# Altium footprint library THU.PcbLib: 477 footprints (part 16 of 30)
Each footprint in its own frame and in the unit in brackets; x right, y up, seen from the top. Pads: shape width x height; smd on the part's side, far side on the other; paste and mask are expansions set on the pad; w line width, h text height; cw(c..) or ccw(c..) is an arc to the next point about the centre after c.
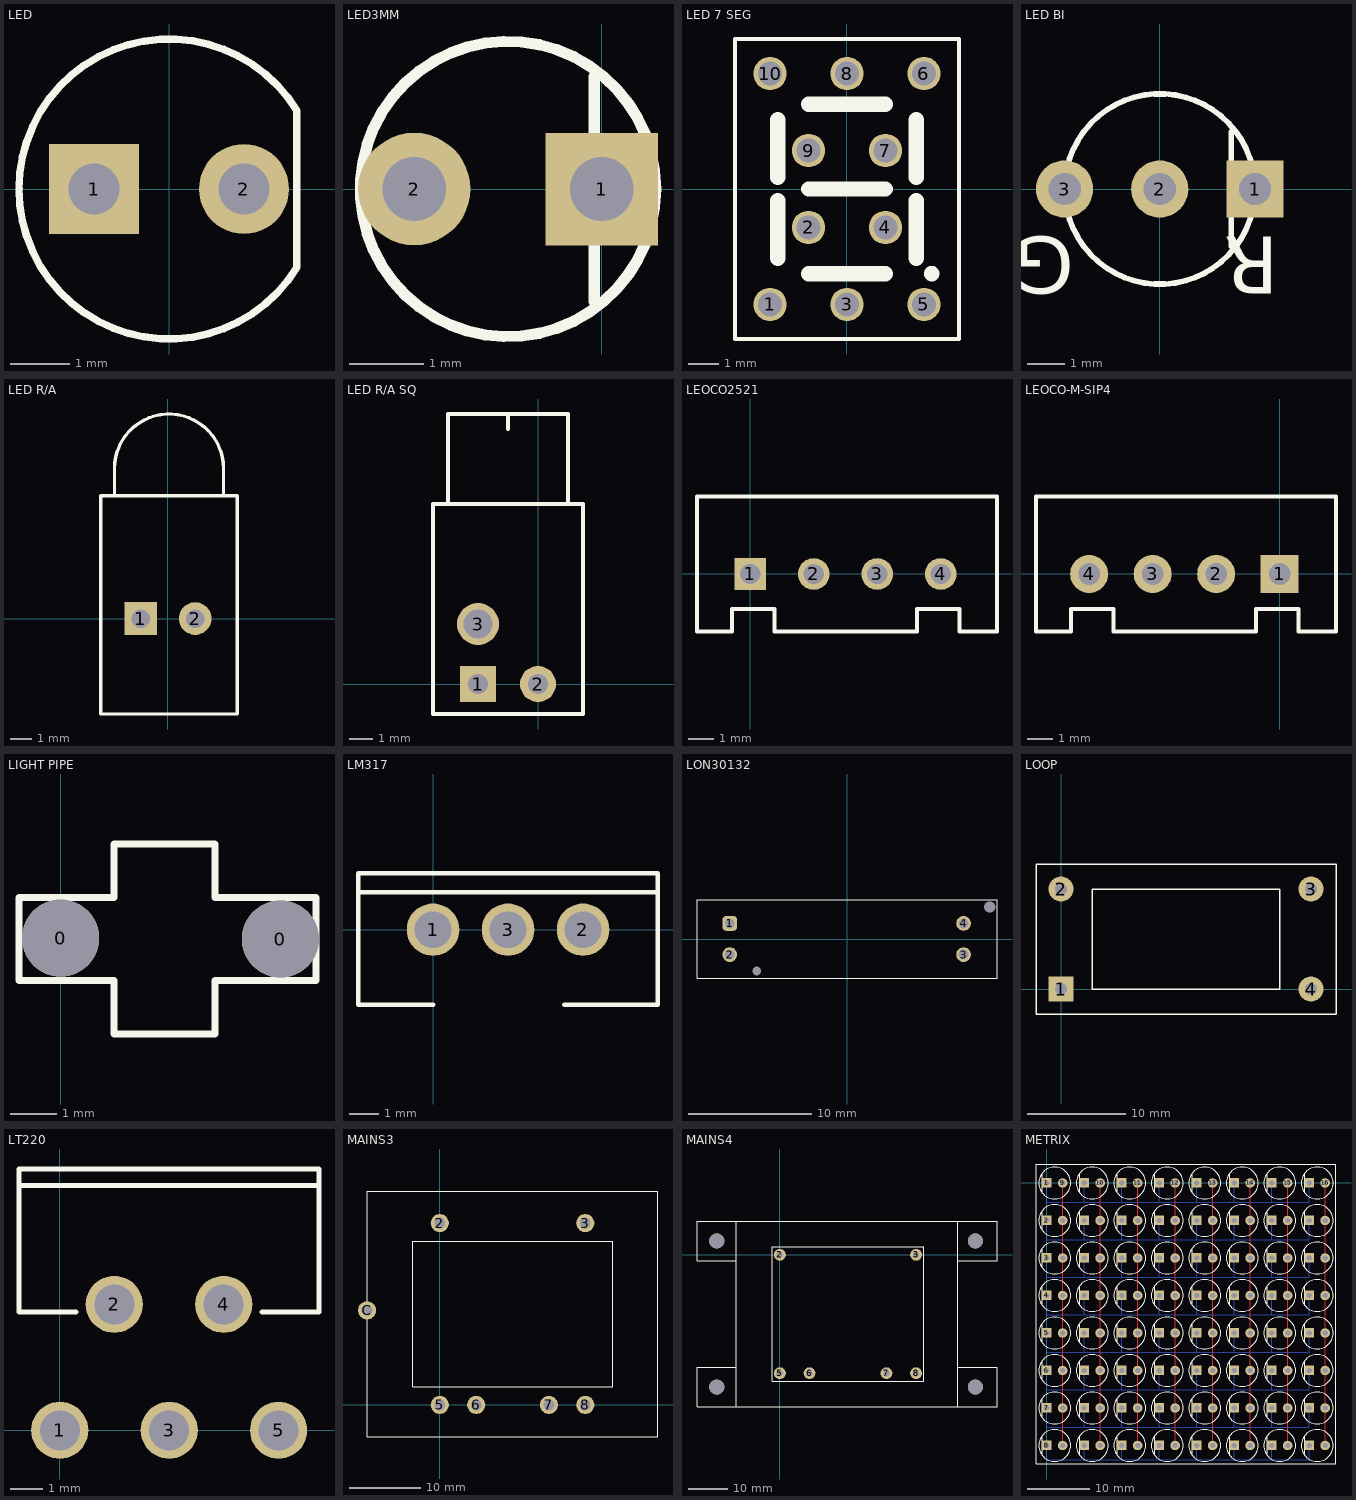
[diagram p15: the footprints below, top view; thin cyan lines are the x and y axes]

## LED [mil]
pads (2):
  rect 60x60 hole 34: 1(-50,0)
  round 60 hole 34: 2(50,0)
TopOverlay:
  lines w5: 85.3,-52.19 cw(c0,0) 85.3,52.19 85.3,-52.19

## LED3MM [mil]
pads (2):
  rect 60x60 hole 34: 1(0,0)
  round 60 hole 34: 2(-100,0)
TopOverlay:
  circle w6: c-50,0 r78.74
  lines w6: -4,-60 -4,60

## LED 7 SEG [mm] "VISHAY SEMICONDUCTOR  TDSL1150"
height 6
pads (10):
  round 1.1 hole 0.8 unplated: 1(-2.54,-3.81) 2(-1.27,-1.27) 3(0,-3.81) 4(1.27,-1.27) 5(2.54,-3.81) 6(2.54,3.81) 7(1.27,1.27) 8(0,3.81) 9(-1.27,1.27) 10(-2.54,3.81)
TopOverlay:
  circle w0.254: c2.794,-2.794 r0.127
  lines w0.127: -3.7,-4.95 3.7,-4.95 3.7,4.95 -3.7,4.95 -3.7,-4.95
  lines w0.508: -2.286,-2.286 -2.286,-0.381 ; -2.286,0.381 -2.286,2.286 ; -1.27,-2.794 1.27,-2.794 ; -1.27,0 1.27,0 ; -1.27,2.794 1.27,2.794 ; 2.286,-2.286 2.286,-0.381 ; 2.286,0.381 2.286,2.286

## LED BI [mil]
pads (3):
  rect 60x60 hole 34: 1(100,0)
  round 60 hole 34: 2(0,0) 3(-100,0)
TopOverlay:
  circle w6: c0,0 r100
  lines w6: 75,-60 75,60
  text "G" at -90,-50 h60
  text "R" at 125,-50 h60

## LED R/A [mil]
pads (2):
  rect 60x60 hole 34: 1(-50,0)
  round 60 hole 34: 2(50,0)
TopOverlay:
  lines w6: -98,225 -98,275 cw(c2,275) 102,275 102,225 ; -123,-175 -123,225 127,225 127,-175 -123,-175

## LED R/A SQ [mil]
pads (3):
  rect 60x60 hole 34: 1(-100,0)
  round 60 hole 34: 2(0,0)
  round 70 hole 49: 3(-100,100)
TopOverlay:
  lines w6: -150,300 -150,450 50,450 50,300 ; -50,425 -50,450 ; -175,-50 -175,300 75,300 75,-50 -175,-50

## LEOCO2521 [mil]
pads (4):
  rect 50x50 hole 32: 1(0,0)
  round 50 hole 32: 2(100,0) 3(200,0) 4(300,0)
TopOverlay:
  lines w6: 388.74,118.11 388.74,-90.55 329.69,-90.55 329.69,-55.12 262.76,-55.12 262.76,-90.55 38.35,-90.55 38.35,-55.12 -28.58,-55.12 -28.58,-90.55 -83.7,-90.55 -83.7,122.05 388.74,122.05

## LEOCO-M-SIP4 [mil]
pads (4):
  rect 60x60 hole 34: 1(0,0)
  round 60 hole 34: 2(-100,0) 3(-200,0) 4(-300,0)
TopOverlay:
  lines w6: 88.74,118.11 88.74,-90.55 29.68,-90.55 29.68,-55.12 -37.24,-55.12 -37.24,-90.55 -261.65,-90.55 -261.65,-55.12 -328.58,-55.12 -328.58,-90.55 -383.7,-90.55 -383.7,122.05 88.74,122.05

## LIGHT PIPE [mil]
pads (2):
  round 65 hole 65 unplated: 0(0,-299.21) 0(185,-300)
TopOverlay:
  lines w6: -35,-335 45,-335 45,-380 130,-380 130,-335 215,-335 215,-265 130,-265 130,-220 45,-220 45,-265 -35,-265 -35,-335

## LM317 [mil]
pads (3):
  round 70 hole 49: 1(0,0) 2(200,0) 3(100,0)
TopOverlay:
  lines w6: 0,-100 -100,-100 -100,50 ; 150,50 175,50 ; 175,-100 300,-100 300,50 ; -100,50 300,50 ; -100,50 -100,75 300,75 300,50

## LON30132 [mm] "LITE ON PHOTOINTERUPPTER"
height 16.5
pads (6):
  round 0.1 hole 0.7 unplated: 0(-7.35,-2.6)
  round 0.1 hole 0.9 unplated: 0(11.6,2.6)
  rrect50% 1.2x1.2 hole 0.8: 1(-9.525,1.27)
  round 1.2 hole 0.8: 2(-9.525,-1.27) 3(9.475,-1.27) 4(9.475,1.27)
TopOverlay:
  lines w0.1: -12.192,-3.175 -12.192,3.175 12.192,3.175 12.192,-3.175 -12.192,-3.175
3D body "Sensor2.step": height 16.5, standoff -2.85, extent -12,-3.05 12,3.05

## LOOP [mil]
pads (4):
  rect 100x100 hole 49: 1(0,0)
  round 100 hole 49: 2(0,400) 3(1000,400) 4(1000,0)
TopOverlay:
  lines w6: -100,-100 1100,-100 1100,500 -100,500 -100,-100 ; 125,0 875,0 875,400 125,400 125,0

## LT220 [mil]
pads (5):
  round 70 hole 49: 1(0,0) 2(66.75,154.27) 3(134.02,0) 4(200.77,154.27) 5(268.03,0)
TopOverlay:
  lines w6: -50,300 317,300 ; 20,145 -50,145 -50,200 -50,320 317,320 ; 247.52,145 317.52,145 317.52,200 317.52,320

## MAINS3 [mil]
pads (7):
  round 100 hole 59: 2(0,1000) 3(800,1000) 5(0,0) 6(200,0) 7(600,0) 8(800,0) C(-400,520)
TopOverlay:
  lines w6: -400,-175 -400,1175 1100,1175 1200,1175 1200,-175 -400,-175 ; -150,100 -150,900 950,900 950,100 -150,100

## MAINS4 [mm]
pads (10):
  round 3 hole 1.6: 2(0,0) 3(34.5,0) 5(0,-30) 6(7.5,-30) 7(27,-30) 8(34.5,-30)
  round 3.81 hole 3.81: ""(-16,-33.5) ""(-16,3.5) ""(49.5,-33.5) ""(49.5,3.5)
TopOverlay:
  lines w0.152: 31.5,8.5 45,8.5 ; 32.5,8.5 -11,8.5 ; -11,-38.5 45,-38.5 ; -11,-38.5 -11,8.5 ; -11,-38.5 -11,-28.5 -21,-28.5 -21,-38.5 -11,-38.5 ; -11,8.5 -11,-1.5 -21,-1.5 -21,8.5 -11,8.5 ; 45,-38.5 45,8.5 ; 45,-38.5 45,-28.5 55,-28.5 55,-38.5 45,-38.5 ; 45,8.5 55,8.5 55,-1.5 45,-1.5 45,8.5 ; -2,-32 36.5,-32 36.5,2 -2,2 -2,-32

## METRIX [mil]
pads (128):
  rect 60x60 hole 34: 1(0,0) 2(0,-236.22) 3(0,-472.44) 4(0,-708.66) 5(0,-944.88) 6(0,-1181.1) 7(0,-1417.32) 8(0,-1653.54) ""(236.22,-1181.1) ""(236.22,-944.88) ""(236.22,-236.22) ""(236.22,0) ""(236.22,-1653.54) ""(236.22,-1417.32) ""(236.22,-708.66) ""(236.22,-472.44) ""(472.44,-1653.54) ""(472.44,-1417.32) ""(472.44,-1181.1) ""(472.44,-944.88) ""(472.44,-708.66) ""(472.44,-472.44) ""(472.44,-236.22) ""(472.44,0) ""(708.66,-1181.1) ""(708.66,-944.88) ""(708.66,-1653.54) ""(708.66,-1417.32) ""(708.66,-708.66) ""(708.66,-472.44) ""(708.66,-236.22) ""(708.66,0) ""(944.88,-1653.54) ""(944.88,-1417.32) ""(944.88,-1181.1) ""(944.88,-944.88) ""(944.88,-708.66) ""(944.88,-472.44) ""(944.88,-236.22) ""(944.88,0) ""(1181.1,-1181.1) ""(1181.1,-944.88) ""(1181.1,-708.66) ""(1181.1,-472.44) ""(1181.1,-236.22) ""(1181.1,0) ""(1181.1,-1653.54) ""(1181.1,-1417.32) ""(1417.32,-1653.54) ""(1417.32,-1417.32) ""(1417.32,-1181.1) ""(1417.32,-944.88) ""(1417.32,-708.66) ""(1417.32,-472.44) ""(1417.32,-236.22) ""(1417.32,0) ""(1653.54,-1181.1) ""(1653.54,-944.88) ""(1653.54,-708.66) ""(1653.54,-472.44) ""(1653.54,-236.22) ""(1653.54,0) ""(1653.54,-1653.54) ""(1653.54,-1417.32)
  round 60 hole 34: 9(100.39,0) 10(336.22,0) 11(572.44,0) 12(808.66,0) 13(1044.88,0) 14(1281.1,0) 15(1517.32,0) 16(1753.54,0) ""(100,-1653.54) ""(100,-1417.32) ""(100,-1181.1) ""(100,-944.88) ""(100,-708.66) ""(100,-472.44) ""(100,-236.22) ""(336.22,-1653.54) ""(336.22,-1417.32) ""(336.22,-1181.1) ""(336.22,-944.88) ""(336.22,-708.66) ""(336.22,-472.44) ""(336.22,-236.22) ""(572.44,-1653.54) ""(572.44,-1417.32) ""(572.44,-1181.1) ""(572.44,-944.88) ""(572.44,-708.66) ""(572.44,-472.44) ""(572.44,-236.22) ""(808.66,-1653.54) ""(808.66,-1417.32) ""(808.66,-1181.1) ""(808.66,-944.88) ""(808.66,-708.66) ""(808.66,-472.44) ""(808.66,-236.22) ""(1044.88,-1653.54) ""(1044.88,-1417.32) ""(1044.88,-1181.1) ""(1044.88,-944.88) ""(1044.88,-708.66) ""(1044.88,-472.44) ""(1044.88,-236.22) ""(1281.1,-1181.1) ""(1281.1,-944.88) ""(1281.1,-708.66) ""(1281.1,-472.44) ""(1281.1,-236.22) ""(1281.1,-1653.54) ""(1281.1,-1417.32) ""(1517.32,-1653.54) ""(1517.32,-1417.32) ""(1517.32,-1181.1) ""(1517.32,-944.88) ""(1517.32,-708.66) ""(1517.32,-472.44) ""(1517.32,-236.22) ""(1753.54,-1181.1) ""(1753.54,-944.88) ""(1753.54,-708.66) ""(1753.54,-472.44) ""(1753.54,-236.22) ""(1753.54,-1653.54) ""(1753.54,-1417.32)
TopLayer:
  lines w6: 100.98,-1656.5 100.98,-1420.28 100.98,-1184.06 100.98,-947.84 100.98,-711.61 100.98,-475.39 100.98,-239.17 100.98,-2.95 ; 337.2,-1656.5 337.2,-1420.28 337.2,-1184.06 337.2,-947.84 337.2,-711.61 337.2,-475.39 337.2,-239.17 337.2,-2.95 ; 573.42,-1656.5 573.42,-1420.28 573.42,-1184.06 573.42,-947.84 573.42,-711.61 573.42,-475.39 573.42,-239.17 573.42,-2.95 ; 809.65,-1656.5 809.65,-1420.28 809.65,-1184.06 809.65,-947.84 809.65,-711.61 809.65,-475.39 809.65,-239.17 809.65,-2.95 ; 1045.87,-1656.5 1045.87,-1420.28 1045.87,-1184.06 1045.87,-947.84 1045.87,-711.61 1045.87,-475.39 1045.87,-239.17 1045.87,-2.95 ; 1282.09,-1656.5 1282.09,-1420.28 1282.09,-1184.06 1282.09,-947.84 1282.09,-711.61 1282.09,-475.39 1282.09,-239.17 1282.09,-2.95 ; 1518.31,-1656.5 1518.31,-1420.28 1518.31,-1184.06 1518.31,-947.84 1518.31,-711.61 1518.31,-475.39 1518.31,-239.17 1518.31,-2.95 ; 1754.53,-1656.5 1754.53,-1420.28 1754.53,-1184.06 1754.53,-947.84 1754.53,-711.61 1754.53,-475.39 1754.53,-239.17 1754.53,-2.95 ; 100,-236.22 100,-236.22 ; 100,-236.22 100,-236.22
BottomLayer:
  lines w6: 0.98,-1656.5 0.98,-1743.11 236.22,-1743.11 ; 0.98,-1420.28 0.98,-1538.39 237.21,-1538.39 ; 0.98,-1184.06 0.98,-1302.16 237.21,-1302.16 ; 0.98,-947.84 0.98,-1065.94 237.21,-1065.94 ; 0.98,-711.61 0.98,-829.72 237.21,-829.72 ; 0.98,-475.39 0.98,-593.5 237.21,-593.5 ; 0.98,-239.17 0.98,-357.28 237.21,-357.28 ; 0.98,-2.95 0.98,-121.06 237.21,-121.06 ; 237.21,-1656.5 236.22,-1743.11 ; 237.21,-1420.28 237.21,-1538.39 ; 237.21,-1184.06 237.21,-1302.16 ; 237.21,-947.84 237.21,-1065.94 ; 237.21,-711.61 237.21,-829.72 ; 237.21,-475.39 237.21,-593.5 ; 237.21,-239.17 237.21,-357.28 ; 237.21,-2.95 237.21,-121.06 ; 473.43,-1656.5 473.43,-1743.11 ; 473.43,-1420.28 473.43,-1538.39 ; 473.43,-1184.06 473.43,-1302.16 ; 473.43,-947.84 473.43,-1065.94 ; 473.43,-711.61 473.43,-829.72 ; 473.43,-475.39 473.43,-593.5 ; 473.43,-239.17 473.43,-357.28 ; 473.43,-2.95 473.43,-121.06 ; 709.65,-1656.5 709.65,-1742.13 ; 709.65,-1420.28 709.65,-1538.39 ; 709.65,-1184.06 709.65,-1302.16 ; 709.65,-947.84 709.65,-1065.94 ; 709.65,-711.61 709.65,-829.72 ; 709.65,-475.39 709.65,-593.5 ; 709.65,-239.17 709.65,-357.28 ; 709.65,-2.95 709.65,-121.06 ; 945.87,-1656.5 945.87,-1743.11 ; 945.87,-1420.28 945.87,-1538.39 ; 945.87,-1184.06 945.87,-1302.16 ; 945.87,-947.84 945.87,-1065.94 ; 945.87,-711.61 945.87,-829.72 ; 945.87,-475.39 945.87,-593.5 ; 945.87,-239.17 945.87,-357.28 ; 945.87,-2.95 945.87,-121.06 ; 1182.09,-1656.5 1182.09,-1742.13 ; 1182.09,-1420.28 1182.09,-1538.39 ; 1182.09,-1184.06 1182.09,-1302.16 ; 1182.09,-947.84 1182.09,-1065.94 ; 1182.09,-711.61 1182.09,-829.72 ; 1182.09,-475.39 1182.09,-593.5 ; 1182.09,-239.17 1182.09,-357.28 ; 1182.09,-2.95 1182.09,-121.06 ; 1418.31,-1656.5 1416.34,-1743.11 ; 1418.31,-1420.28 1418.31,-1538.39 ; 1418.31,-1184.06 1418.31,-1302.16 ; 1418.31,-947.84 1418.31,-1065.94 ; 1418.31,-711.61 1418.31,-829.72 ; 1418.31,-475.39 1418.31,-593.5 ; 1418.31,-239.17 1418.31,-357.28 ; 1418.31,-2.95 1418.31,-121.06 ; 1654.53,-1656.5 1654.53,-1742.13 1416.34,-1743.11 ; 1654.53,-1420.28 1654.53,-1538.39 1418.31,-1538.39 ; 1654.53,-1184.06 1654.53,-1302.16 1418.31,-1302.16 ; 1654.53,-947.84 1654.53,-1065.94 1418.31,-1065.94 ; 1654.53,-711.61 1654.53,-829.72 1418.31,-829.72 ; 1654.53,-475.39 1654.53,-593.5 1418.31,-593.5 ; 1654.53,-239.17 1654.53,-357.28 1418.31,-357.28 ; 1654.53,-2.95 1654.53,-121.06 1418.31,-121.06 ; 236.22,-1743.11 473.43,-1743.11 ; 237.21,-1538.39 473.43,-1538.39 ; 237.21,-1302.16 473.43,-1302.16 ; 237.21,-1065.94 473.43,-1065.94 ; 237.21,-829.72 473.43,-829.72 ; 237.21,-593.5 473.43,-593.5 ; 237.21,-357.28 473.43,-357.28 ; 237.21,-121.06 473.43,-121.06 ; 473.43,-1743.11 709.65,-1742.13 ; 473.43,-1538.39 709.65,-1538.39 ; 473.43,-1302.16 709.65,-1302.16 ; 473.43,-1065.94 709.65,-1065.94 ; 473.43,-829.72 709.65,-829.72 ; 473.43,-593.5 709.65,-593.5 ; 473.43,-357.28 709.65,-357.28 ; 473.43,-121.06 709.65,-121.06 ; 709.65,-1742.13 945.87,-1743.11 ; 709.65,-1538.39 945.87,-1538.39 ; 709.65,-1302.16 945.87,-1302.16 ; 709.65,-1065.94 945.87,-1065.94 ; 709.65,-829.72 945.87,-829.72 ; 709.65,-593.5 945.87,-593.5 ; 709.65,-357.28 945.87,-357.28 ; 709.65,-121.06 945.87,-121.06 ; 945.87,-1743.11 1182.09,-1742.13 ; 945.87,-1538.39 1182.09,-1538.39 ; 945.87,-1302.16 1182.09,-1302.16 ; 945.87,-1065.94 1182.09,-1065.94 ; 945.87,-829.72 1182.09,-829.72 ; 945.87,-593.5 1182.09,-593.5 ; 945.87,-357.28 1182.09,-357.28 ; 945.87,-121.06 1182.09,-121.06 ; 1182.09,-1742.13 1416.34,-1743.11 ; 1182.09,-1538.39 1418.31,-1538.39 ; 1182.09,-1302.16 1418.31,-1302.16 ; 1182.09,-1065.94 1418.31,-1065.94 ; 1182.09,-829.72 1418.31,-829.72 ; 1182.09,-593.5 1418.31,-593.5 ; 1182.09,-357.28 1418.31,-357.28 ; 1182.09,-121.06 1418.31,-121.06
TopOverlay:
  circle w6: c50,0 r100
  circle w6: c286.22,0 r100
  circle w6: c522.44,0 r100
  circle w6: c758.66,0 r100
  circle w6: c994.88,0 r100
  circle w6: c1231.1,0 r100
  circle w6: c1467.32,0 r100
  circle w6: c1703.54,0 r100
  circle w6: c50,-236.22 r100
  circle w6: c286.22,-236.22 r100
  circle w6: c522.44,-236.22 r100
  circle w6: c758.66,-236.22 r100
  circle w6: c994.88,-236.22 r100
  circle w6: c1231.1,-236.22 r100
  circle w6: c1467.32,-236.22 r100
  circle w6: c1703.54,-236.22 r100
  circle w6: c50,-472.44 r100
  circle w6: c522.44,-472.44 r100
  circle w6: c758.66,-472.44 r100
  circle w6: c994.88,-472.44 r100
  circle w6: c1231.1,-472.44 r100
  circle w6: c1467.32,-472.44 r100
  circle w6: c1703.54,-472.44 r100
  circle w6: c50,-708.66 r100
  circle w6: c286.22,-708.66 r100
  circle w6: c522.44,-708.66 r100
  circle w6: c758.66,-708.66 r100
  circle w6: c994.88,-708.66 r100
  circle w6: c1231.1,-708.66 r100
  circle w6: c1467.32,-708.66 r100
  circle w6: c1703.54,-708.66 r100
  circle w6: c50,-944.88 r100
  circle w6: c286.22,-944.88 r100
  circle w6: c522.44,-944.88 r100
  circle w6: c758.66,-944.88 r100
  circle w6: c994.88,-944.88 r100
  circle w6: c1231.1,-944.88 r100
  circle w6: c1467.32,-944.88 r100
  circle w6: c1703.54,-944.88 r100
  circle w6: c50,-1181.1 r100
  circle w6: c286.22,-1181.1 r100
  circle w6: c522.44,-1181.1 r100
  circle w6: c758.66,-1181.1 r100
  circle w6: c994.88,-1181.1 r100
  circle w6: c1231.1,-1181.1 r100
  circle w6: c1467.32,-1181.1 r100
  circle w6: c50,-1417.32 r100
  circle w6: c286.22,-1417.32 r100
  circle w6: c522.44,-1417.32 r100
  circle w6: c758.66,-1417.32 r100
  circle w6: c994.88,-1417.32 r100
  circle w6: c1231.1,-1417.32 r100
  circle w6: c1467.32,-1417.32 r100
  circle w6: c1703.54,-1417.32 r100
  circle w6: c50,-1653.54 r100
  circle w6: c286.22,-1653.54 r100
  circle w6: c522.44,-1653.54 r100
  circle w6: c758.66,-1653.54 r100
  circle w6: c994.88,-1653.54 r100
  circle w6: c1231.1,-1653.54 r100
  circle w6: c1467.32,-1653.54 r100
  circle w6: c1703.54,-1653.54 r100
  circle w6: c286.22,-472.44 r100
  circle w6: c1703.54,-1181.1 r100
  lines w6: -30,-1713.54 -30,-1593.54 ; -30,-1477.32 -30,-1357.32 ; -30,-1241.1 -30,-1121.1 ; -30,-1004.88 -30,-884.88 ; -30,-768.66 -30,-648.66 ; -30,-532.44 -30,-412.44 ; -30,-296.22 -30,-176.22 ; -30,-60 -30,60 ; 206.22,-1713.54 206.22,-1593.54 ; 206.22,-1477.32 206.22,-1357.32 ; 206.22,-1241.1 206.22,-1121.1 ; 206.22,-1004.88 206.22,-884.88 ; 206.22,-768.66 206.22,-648.66 ; 206.22,-532.44 206.22,-412.44 ; 206.22,-296.22 206.22,-176.22 ; 206.22,-60 206.22,60 ; 442.44,-1713.54 442.44,-1593.54 ; 442.44,-1477.32 442.44,-1357.32 ; 442.44,-1241.1 442.44,-1121.1 ; 442.44,-1004.88 442.44,-884.88 ; 442.44,-768.66 442.44,-648.66 ; 442.44,-532.44 442.44,-412.44 ; 442.44,-296.22 442.44,-176.22 ; 442.44,-60 442.44,60 ; 678.66,-1713.54 678.66,-1593.54 ; 678.66,-1477.32 678.66,-1357.32 ; 678.66,-1241.1 678.66,-1121.1 ; 678.66,-1004.88 678.66,-884.88 ; 678.66,-768.66 678.66,-648.66 ; 678.66,-532.44 678.66,-412.44 ; 678.66,-296.22 678.66,-176.22 ; 678.66,-60 678.66,60 ; 914.88,-1713.54 914.88,-1593.54 ; 914.88,-1477.32 914.88,-1357.32 ; 914.88,-1241.1 914.88,-1121.1 ; 914.88,-1004.88 914.88,-884.88 ; 914.88,-768.66 914.88,-648.66 ; 914.88,-532.44 914.88,-412.44 ; 914.88,-296.22 914.88,-176.22 ; 914.88,-60 914.88,60 ; 1151.1,-1713.54 1151.1,-1593.54 ; 1151.1,-1477.32 1151.1,-1357.32 ; 1151.1,-1241.1 1151.1,-1121.1 ; 1151.1,-1004.88 1151.1,-884.88 ; 1151.1,-768.66 1151.1,-648.66 ; 1151.1,-532.44 1151.1,-412.44 ; 1151.1,-296.22 1151.1,-176.22 ; 1151.1,-60 1151.1,60 ; 1387.32,-1713.54 1387.32,-1593.54 ; 1387.32,-1477.32 1387.32,-1357.32 ; 1387.32,-1241.1 1387.32,-1121.1 ; 1387.32,-1004.88 1387.32,-884.88 ; 1387.32,-768.66 1387.32,-648.66 ; 1387.32,-532.44 1387.32,-412.44 ; 1387.32,-296.22 1387.32,-176.22 ; 1387.32,-60 1387.32,60 ; 1623.54,-1713.54 1623.54,-1593.54 ; 1623.54,-1477.32 1623.54,-1357.32 ; 1623.54,-1241.1 1623.54,-1121.1 ; 1623.54,-1004.88 1623.54,-884.88 ; 1623.54,-768.66 1623.54,-648.66 ; 1623.54,-532.44 1623.54,-412.44 ; 1623.54,-296.22 1623.54,-176.22 ; 1623.54,-60 1623.54,60 ; -67.91,-1768.7 -67.91,118.11 1821.85,118.11 1821.85,-1768.7 -67.91,-1768.7